# Altium footprint library 3.22-杂项.PcbLib: 985 footprints (part 14 of 64)
Each footprint in its own frame and in the unit in brackets; x right, y up, seen from the top. Pads: shape width x height; smd on the part's side, far side on the other; paste and mask are expansions set on the pad; w line width, h text height; cw(c..) or ccw(c..) is an arc to the next point about the centre after c.
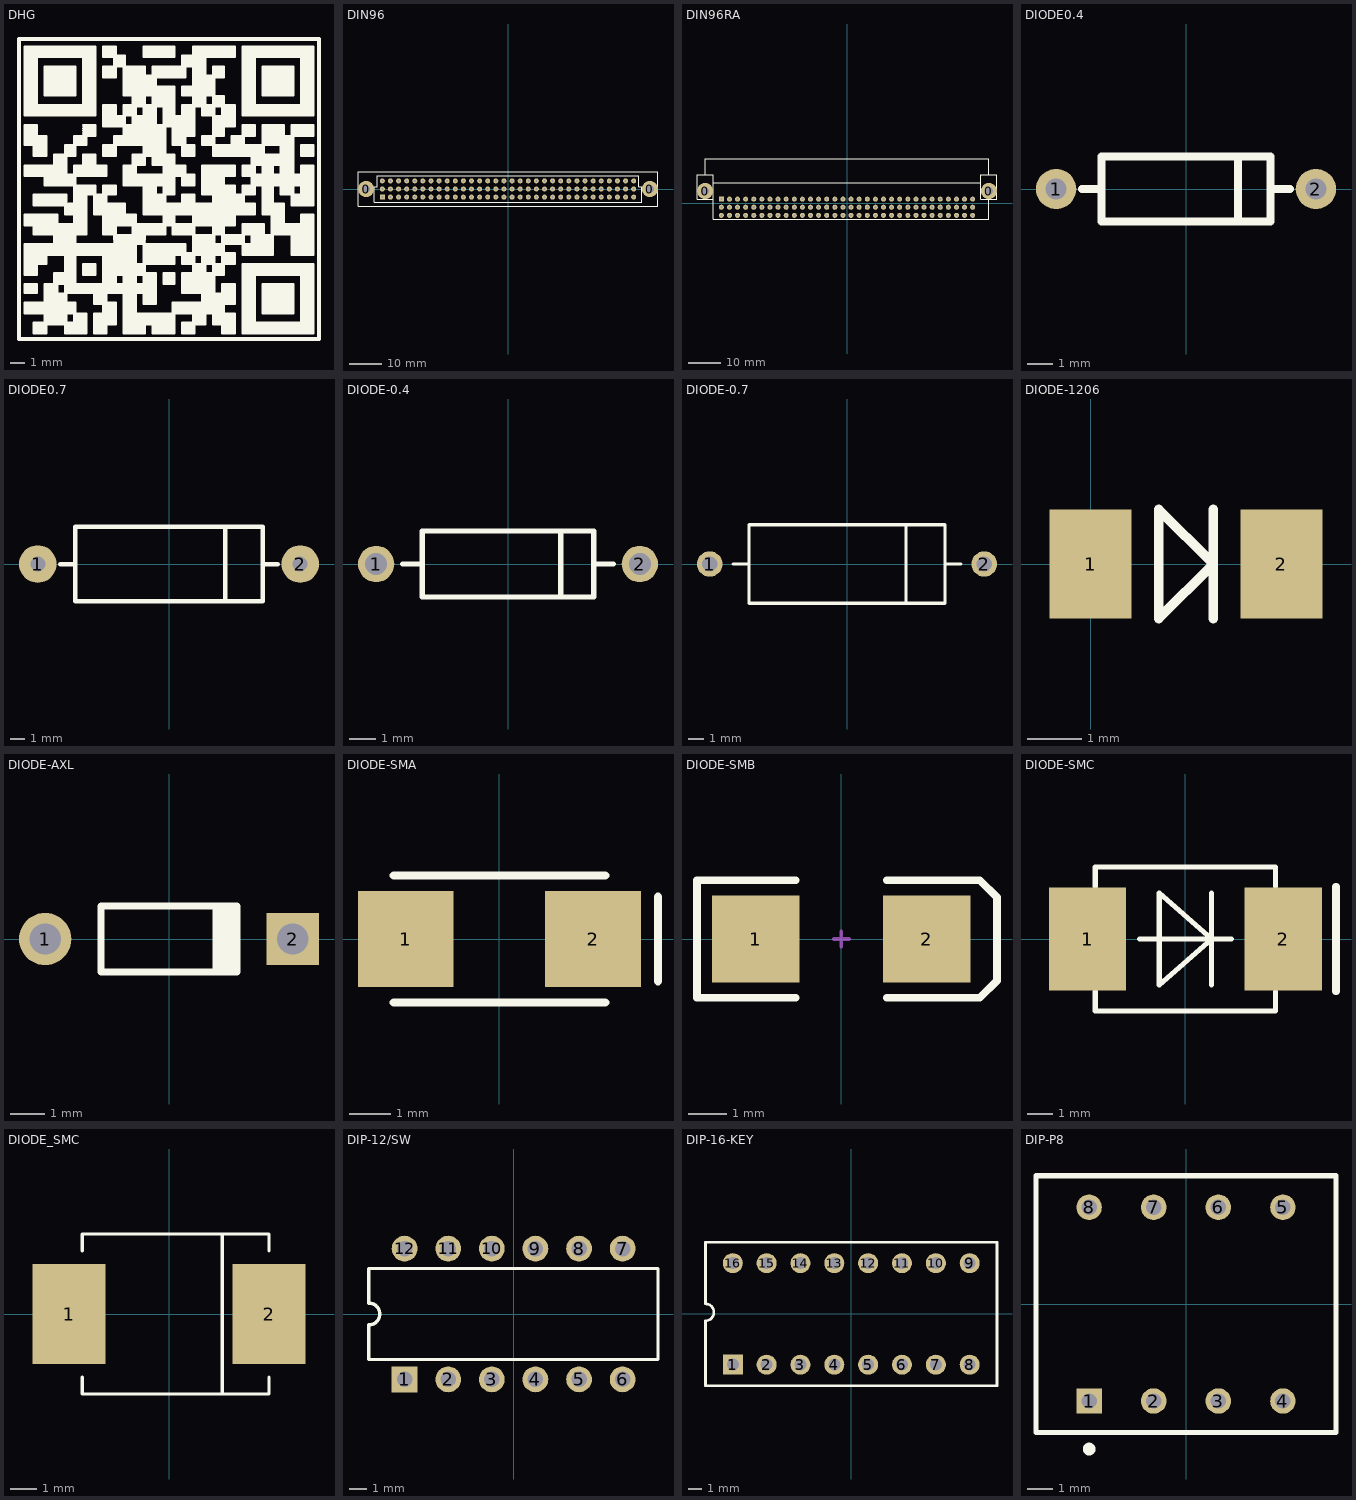
[diagram p13: the footprints below, top view; thin cyan lines are the x and y axes]

## DHG [mil]
Top Overlay:
  drawing of 1510 lines, arcs and shapes, not listed

## DIN96 [mil]
pads (98):
  round 200 hole 100: 0(-1750,0) 0(1750,0)
  rect 62x62 hole 25: 1A(-1550,-100)
  round 62 hole 25: 1B(-1550,0) 1C(-1550,100) 2A(-1450,-100) 2B(-1450,0) 2C(-1450,100) 3A(-1350,-100) 3B(-1350,0) 3C(-1350,100) 4A(-1250,-100) 4B(-1250,0) 4C(-1250,100) 5A(-1150,-100) 5B(-1150,0) 5C(-1150,100) 6A(-1050,-100) 6B(-1050,0) 6C(-1050,100) 7A(-950,-100) 7B(-950,0) 7C(-950,100) 8A(-850,-100) 8B(-850,0) 8C(-850,100) 9A(-750,-100) 9B(-750,0) 9C(-750,100) 10A(-650,-100) 10B(-650,0) 10C(-650,100) 11A(-550,-100) 11B(-550,0) 11C(-550,100) 12A(-450,-100) 12B(-450,0) 12C(-450,100) 13A(-350,-100) 13B(-350,0) 13C(-350,100) 14A(-250,-100) 14B(-250,0) 14C(-250,100) 15A(-150,-100) 15B(-150,0) 15C(-150,100) 16A(-50,-100) 16B(-50,0) 16C(-50,100) 17A(50,-100) 17B(50,0) 17C(50,100) 18A(150,-100) 18B(150,0) 18C(150,100) 19A(250,-100) 19B(250,0) 19C(250,100) 20A(350,-100) 20B(350,0) 20C(350,100) 21A(450,-100) 21B(450,0) 21C(450,100) 22A(550,-100) 22B(550,0) 22C(550,100) 23A(650,-100) 23B(650,0) 23C(650,100) 24A(750,-100) 24B(750,0) 24C(750,100) 25A(850,-100) 25B(850,0) 25C(850,100) 26A(950,-100) 26B(950,0) 26C(950,100) 27A(1050,-100) 27B(1050,0) 27C(1050,100) 28A(1150,-100) 28B(1150,0) 28C(1150,100) 29A(1250,-100) 29B(1250,0) 29C(1250,100) 30A(1350,-100) 30B(1350,0) 30C(1350,100) 31A(1450,-100) 31B(1450,0) 31C(1450,100) 32A(1550,-100) 32B(1550,0) 32C(1550,100)
Top Overlay:
  lines w10: -1850,-210 1850,-210 1850,210 -1850,210 -1850,-210 ; -1650,-165 1650,-165 1650,30 1615,30 1615,165 -1615,165 -1615,30 -1650,30 -1650,-165

## DIN96RA [mil]
pads (98):
  round 200 hole 100: 0(-1750,150) 0(1750,150)
  rect 62x62 hole 25: 1A(-1550,50)
  round 62 hole 25: 1B(-1550,-50) 1C(-1550,-150) 2A(-1450,50) 2B(-1450,-50) 2C(-1450,-150) 3A(-1350,50) 3B(-1350,-50) 3C(-1350,-150) 4A(-1250,50) 4B(-1250,-50) 4C(-1250,-150) 5A(-1150,50) 5B(-1150,-50) 5C(-1150,-150) 6A(-1050,50) 6B(-1050,-50) 6C(-1050,-150) 7A(-950,50) 7B(-950,-50) 7C(-950,-150) 8A(-850,50) 8B(-850,-50) 8C(-850,-150) 9A(-750,50) 9B(-750,-50) 9C(-750,-150) 10A(-650,50) 10B(-650,-50) 10C(-650,-150) 11A(-550,50) 11B(-550,-50) 11C(-550,-150) 12A(-450,50) 12B(-450,-50) 12C(-450,-150) 13A(-350,50) 13B(-350,-50) 13C(-350,-150) 14A(-250,50) 14B(-250,-50) 14C(-250,-150) 15A(-150,50) 15B(-150,-50) 15C(-150,-150) 16A(-50,50) 16B(-50,-50) 16C(-50,-150) 17A(50,50) 17B(50,-50) 17C(50,-150) 18A(150,50) 18B(150,-50) 18C(150,-150) 19A(250,50) 19B(250,-50) 19C(250,-150) 20A(350,50) 20B(350,-50) 20C(350,-150) 21A(450,50) 21B(450,-50) 21C(450,-150) 22A(550,50) 22B(550,-50) 22C(550,-150) 23A(650,50) 23B(650,-50) 23C(650,-150) 24A(750,50) 24B(750,-50) 24C(750,-150) 25A(850,50) 25B(850,-50) 25C(850,-150) 26A(950,50) 26B(950,-50) 26C(950,-150) 27A(1050,50) 27B(1050,-50) 27C(1050,-150) 28A(1150,50) 28B(1150,-50) 28C(1150,-150) 29A(1250,50) 29B(1250,-50) 29C(1250,-150) 30A(1350,50) 30B(1350,-50) 30C(1350,-150) 31A(1450,50) 31B(1450,-50) 31C(1450,-150) 32A(1550,50) 32B(1550,-50) 32C(1550,-150)
Top Overlay:
  lines w10: -1650,250 1650,250 ; 1750,50 1750,-200 -1650,-200 -1650,50 ; -1750,350 -1650,350 -1650,50 ; -1750,350 -1850,350 -1850,50 -1650,50 ; -1750,350 -1750,550 1750,550 1750,350 ; 1750,350 1850,350 1850,50 1650,50 1650,350 1750,350

## DIODE0.4 [mil]
pads (2):
  round 62 hole 32: 1(-200,0) 2(200,0)
Top Overlay:
  lines w12: -160,0 -130,0 ; 80,-50 80,50 ; 130,0 160,0 ; -130,-50 -130,50 130,50 130,-50 -130,-50

## DIODE0.7 [mil] "A    K"
pads (2):
  round 100 hole 40: 1(-350,0) 2(350,0)
Top Overlay:
  lines w12: -290,0 -250,0 ; 150,-100 150,100 ; 250,0 290,0 ; -250,-100 250,-100 250,100 -250,100 -250,-100

## DIODE-0.4 [mm] "1  2"
height 2.54
pads (2):
  round 1.4 hole 0.85: 1(-5.08,0) 2(5.08,0)
Top Overlay:
  lines w0.2: -4.064,0 -3.302,0 ; 2.032,-1.27 2.032,1.27 ; 3.302,0 4.064,0 ; -3.302,-1.27 3.302,-1.27 3.302,1.27 -3.302,1.27 -3.302,-1.27

## DIODE-0.7 [mm] "Zener Diode; 2 Leads"
height 5.08
pads (2):
  round 1.65 hole 1: 1(-8.89,0) 2(8.89,0)
Top Overlay:
  lines w0.2: -7.366,0 -6.35,0 ; 3.81,-2.54 3.81,2.54 ; 6.35,0 7.366,0 ; -6.35,-2.54 6.35,-2.54 6.35,2.54 -6.35,2.54 -6.35,-2.54

## DIODE-1206 [mm] "玻璃封装二极管"
height 3
pads (2):
  rect 1.5x2 smd: 1(0,0) 2(3.5,0)
Top Overlay:
  lines w0.178: 2.25,-1 2.25,1 ; 1.25,-1 1.25,1 2.25,0 1.25,-1

## DIODE-AXL [mm] "直插二极管"
height 1.9
pads (2):
  round 1.5 hole 0.9: 1(-3.55,0)
  rect 1.5x1.5 hole 0.9: 2(3.55,0)
Top Overlay:
  rectangle: 1.25,-0.95 2.05,0.95
  lines w0.2: 1.95,-0.95 -1.95,-0.95 -1.95,0.95 1.95,0.95

## DIODE-SMA [mm] "贴片二极管"
height 2.54
pads (2):
  rect 2.3x2.3 smd: 1(-2.25,0) 2(2.25,0)
Top Overlay:
  lines w0.2: -2.54,-1.524 2.54,-1.524 ; -2.54,1.524 2.54,1.524 ; 3.81,-1.016 3.81,1.016
3D body: height 3, standoff 0, extent -2.921,-1.397 2.921,1.397

## DIODE-SMB [mm] "DO-214-AA/SMB; 2 C-Bend Leads; Body 5.3 x 3.6 mm, inc. leads (LxW)"
height 2.54
pads (2):
  rect 2.3x2.3 smd: 1(-2.25,0) 2(2.25,0)
Top Overlay:
  lines w0.2: -1.2,-1.55 -3.8,-1.55 -3.8,1.55 -1.2,1.55 ; 1.2,-1.55 3.65,-1.55 4.1,-1.1 4.1,1.1 3.65,1.55 1.2,1.55
Mechanical 1:
  lines w0.1: -0.2,0 0.2,0 ; 0,-0.2 0,0.2

## DIODE-SMC [mm] "贴片二极管"
height 1.5
pads (2):
  rect 3x4 smd: 1(-3.8,0) 2(3.8,0)
Top Overlay:
  lines w0.2: -3.5,-2.032 -3.5,-2.794 3.5,-2.794 3.5,-2.032 ; -3.5,2.032 -3.5,2.794 3.5,2.794 3.5,2.032 ; -1.778,0 1.778,0 ; 1.016,-1.778 1.016,1.778 ; -1.016,-1.778 1.016,0 -1.016,1.778 -1.016,-1.778
  lines w0.3: 5.842,-2.032 5.842,2.032
3D body: height 1.05, standoff 1, extent 2.921,-2.794 3.429,2.794
3D body: height 1, standoff 0, extent -3.429,-2.794 3.556,2.794
3D body: height 0.8, standoff 0, extent 3.556,-1.905 3.937,1.905
3D body: height 0.8, standoff 0, extent -3.81,-1.905 -3.429,1.905

## DIODE_SMC [mil] "Magnetic-Core Inductor with Winding Polarity Marking; 2 Leads"
pads (2):
  rect 110x150 smd: 1(-150,0) 2(150,0)
Top Overlay:
  lines w5: -130,-95 -130,-120 150,-120 150,-95 ; -130,95 -130,120 150,120 150,95 ; 80,-120 80,120
Mechanical 1:
  lines w1: -130,-120 150,-120 ; -130,120 150,120

## DIP-12/SW [mm] "DIP Switch; 12 Leads"
height 5.8
pads (12):
  rect 1.5x1.5 hole 0.9: 1(-6.35,-3.81)
  round 1.5 hole 0.9: 2(-3.81,-3.81) 3(-1.27,-3.81) 4(1.27,-3.81) 5(3.81,-3.81) 6(6.35,-3.81) 7(6.35,3.81) 8(3.81,3.81) 9(1.27,3.81) 10(-1.27,3.81) 11(-3.81,3.81) 12(-6.35,3.81)
Top Overlay:
  lines w0.2: -8.43,-2.65 8.41,-2.65 8.41,2.65 -8.43,2.65 -8.43,0.635 cw(c-8.43,0) -8.43,-0.635 -8.43,-2.65

## DIP-16-KEY [mm] "DIP; 16 Leads; Row Spacing 7.62 mm; Pitch 2.54 mm"
pads (16):
  rect 1.5x1.5 hole 0.9: 1(-8.89,-3.81)
  round 1.5 hole 0.9: 2(-6.35,-3.81) 3(-3.81,-3.81) 4(-1.27,-3.81) 5(1.27,-3.81) 6(3.81,-3.81) 7(6.35,-3.81) 8(8.89,-3.81) 9(8.89,3.81) 10(6.35,3.81) 11(3.81,3.81) 12(1.27,3.81) 13(-1.27,3.81) 14(-3.81,3.81) 15(-6.35,3.81) 16(-8.89,3.81)
Top Overlay:
  lines w0.2: -10.94,0.76 cw(c-10.94,0.125) -10.94,-0.51 -10.94,-5.4 10.94,-5.4 10.94,5.39 -10.94,5.39 -10.94,0.79

## DIP-P8 [mm] "Dual-Pole Dual-Throw Relay; 8 Leads"
pads (8):
  rect 1x1 hole 0.6: 1(-3.81,-3.81)
  round 1 hole 0.6: 2(-1.27,-3.81) 3(1.27,-3.81) 4(3.81,-3.81) 5(3.81,3.81) 6(1.27,3.81) 7(-1.27,3.81) 8(-3.81,3.81)
Top Overlay:
  circle w0.25: c-3.81,-5.7 r0.125
  lines w0.2: -5.9,-5.05 5.9,-5.05 5.9,5.05 -5.9,5.05 -5.9,-0.635 -5.9,-5.05